# Altium footprint library Connektor.PcbLib: 305 footprints (part 17 of 20)
Each footprint in its own frame and in the unit in brackets; x right, y up, seen from the top. Pads: shape width x height; smd on the part's side, far side on the other; paste and mask are expansions set on the pad; w line width, h text height; cw(c..) or ccw(c..) is an arc to the next point about the centre after c.
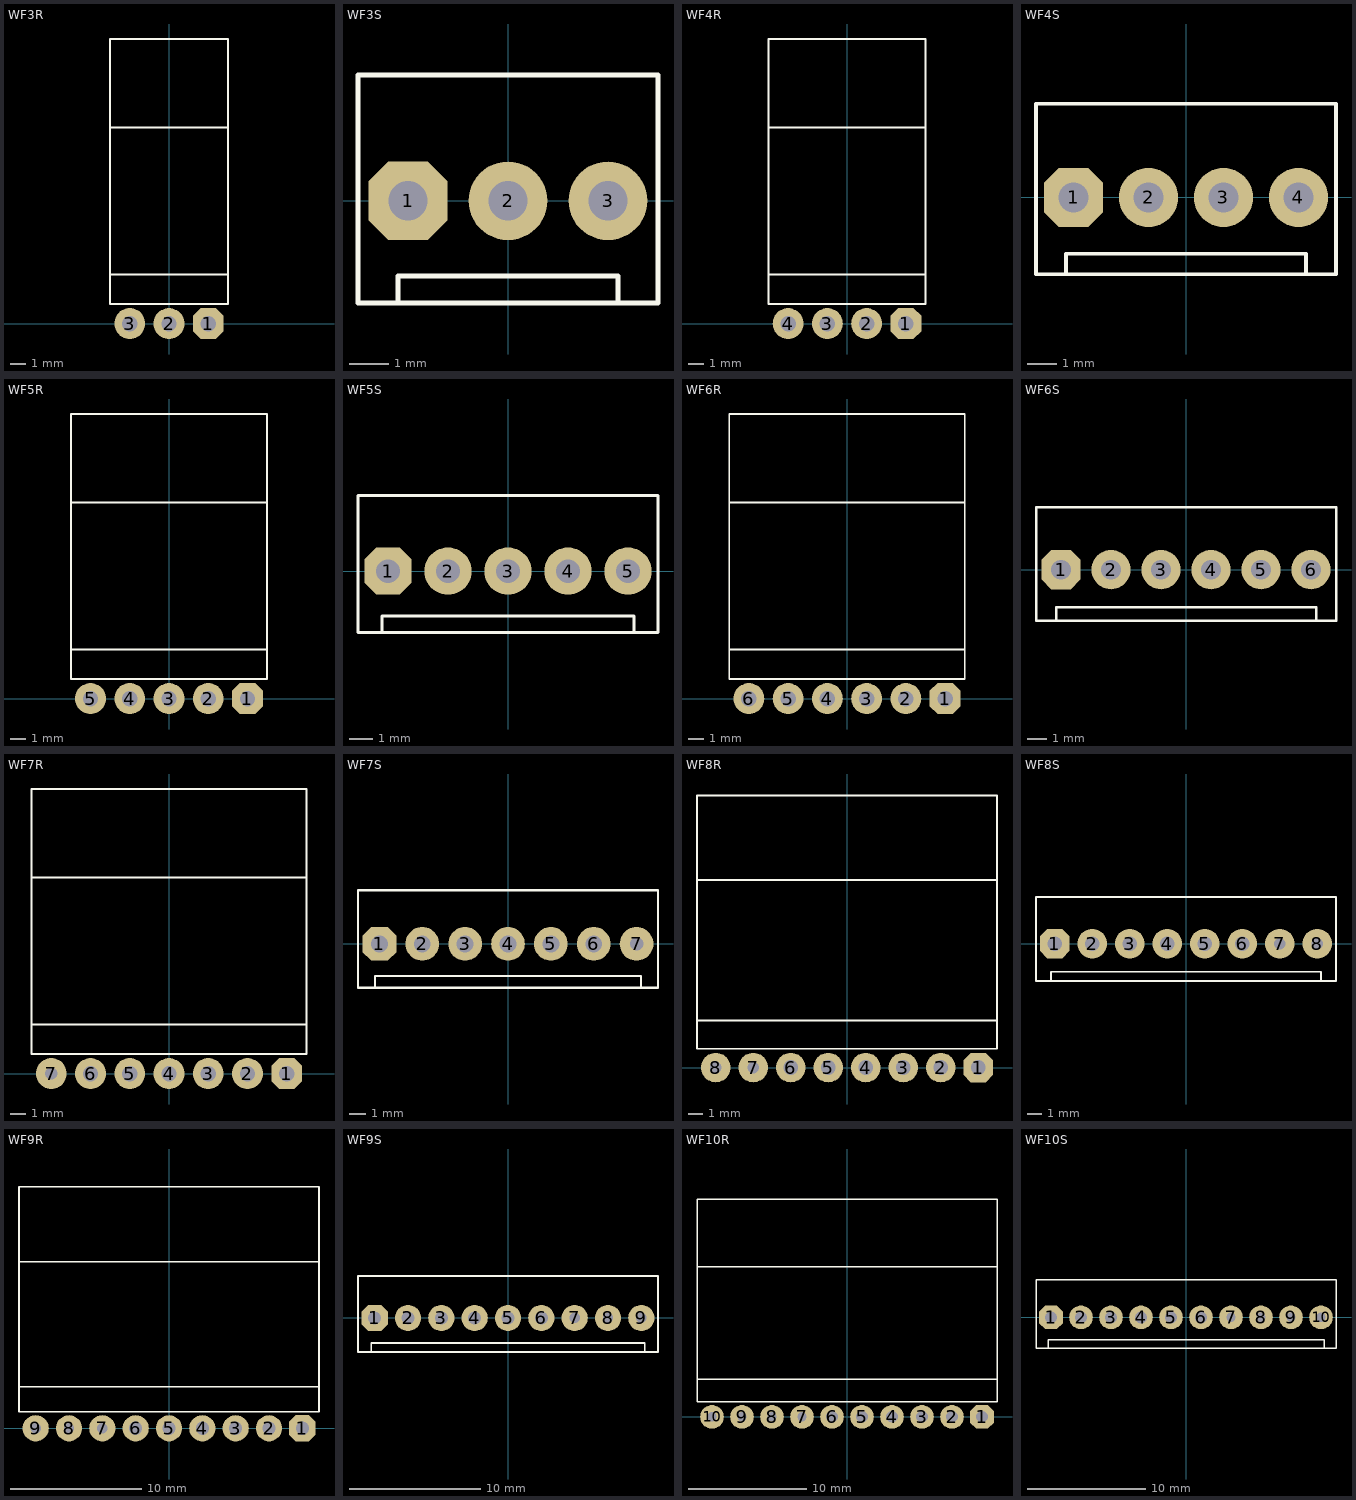
[diagram p16: the footprints below, top view; thin cyan lines are the x and y axes]

## WF3R [mm]
pads (3):
  oct 2x2 hole 1: 1(2.54,0)
  round 2 hole 1: 2(0,0) 3(-2.54,0)
TopOverlay:
  lines w0.127: -3.81,3.175 3.81,3.175 ; -3.81,12.7 3.81,12.7 ; -3.81,1.27 2.54,1.27 3.81,1.27 3.81,18.415 -3.81,18.415 -3.81,1.27
3D body: height 5.8, standoff -2.54, extent -3.81,-0.325 3.81,13.5

## WF3S [mm]
pads (3):
  oct 2x2 hole 1: 1(-2.54,0)
  round 2 hole 1: 2(0,0) 3(2.54,0)
TopOverlay:
  lines w0.127: -2.794,-2.6 -2.794,-1.905 2.794,-1.905 2.794,-2.6 ; -3.81,-2.6 -3.81,3.2 3.81,3.2 3.81,-2.6 -3.81,-2.6
3D body: height 11.5, standoff -3, extent -3.81,-2.6 3.81,3.2

## WF4R [mm]
pads (4):
  oct 2x2 hole 1: 1(3.81,0)
  round 2 hole 1: 2(1.27,0) 3(-1.27,0) 4(-3.81,0)
TopOverlay:
  lines w0.127: -5.08,3.175 5.08,3.175 ; -5.08,12.7 5.08,12.7 ; -5.08,1.27 -5.08,18.415 5.08,18.415 5.08,1.27 1.27,1.27 -5.08,1.27
3D body: height 5.8, standoff -2.54, extent -5.08,-0.325 5.08,13.5

## WF4S [mm]
pads (4):
  oct 2x2 hole 1: 1(-3.81,0)
  round 2 hole 1: 2(-1.27,0) 3(1.27,0) 4(3.81,0)
TopOverlay:
  lines w0.127: -4.064,-2.6 -4.064,-1.905 4.064,-1.905 4.064,-2.6 ; -5.08,-2.6 5.08,-2.6 5.08,3.175 -5.08,3.175 -5.08,-2.6
3D body: height 11.5, standoff -3, extent -5.08,-2.6 5.08,3.2

## WF5R [mm]
pads (5):
  oct 2x2 hole 1: 1(5.08,0)
  round 2 hole 1: 2(2.54,0) 3(0,0) 4(-2.54,0) 5(-5.08,0)
TopOverlay:
  lines w0.127: -6.35,3.175 6.35,3.175 ; -6.35,12.7 6.35,12.7 ; -6.35,1.27 0,1.27 6.35,1.27 6.35,17.78 6.35,18.415 -6.35,18.415 -6.35,1.27
3D body: height 5.8, standoff -2.54, extent -6.35,-0.325 6.35,13.5

## WF5S [mm]
pads (5):
  oct 2x2 hole 1: 1(-5.08,0)
  round 2 hole 1: 2(-2.54,0) 3(0,0) 4(2.54,0) 5(5.08,0)
TopOverlay:
  lines w0.127: -5.334,-2.6 -5.334,-1.905 5.334,-1.905 5.334,-2.6 ; -6.35,-2.6 6.35,-2.6 6.35,3.2 -6.35,3.2 -6.35,-2.6
3D body: height 11.5, standoff -3, extent -6.35,-2.6 6.35,3.2

## WF6R [mm]
pads (6):
  oct 2x2 hole 1: 1(6.35,0)
  round 2 hole 1: 2(3.81,0) 3(1.27,0) 4(-1.27,0) 5(-3.81,0) 6(-6.35,0)
TopOverlay:
  lines w0.127: -7.62,3.175 7.62,3.175 ; -7.62,12.7 7.62,12.7 ; -7.62,1.27 -1.27,1.27 7.62,1.27 7.62,18.415 5.08,18.415 -7.62,18.415 -7.62,1.27
3D body: height 5.8, standoff -2.54, extent -7.62,-0.325 7.62,13.5

## WF6S [mm]
pads (6):
  oct 2x2 hole 1: 1(-6.35,0)
  round 2 hole 1: 2(-3.81,0) 3(-1.27,0) 4(1.27,0) 5(3.81,0) 6(6.35,0)
TopOverlay:
  lines w0.127: -6.604,-2.6 -6.604,-1.905 6.604,-1.905 6.604,-2.6 ; -7.62,-2.6 7.62,-2.6 7.62,3.175 -7.62,3.175 -7.62,-2.6
3D body: height 11.5, standoff -3, extent -7.62,-2.6 7.62,3.2

## WF7R [mm]
pads (7):
  oct 2x2 hole 1: 1(7.62,0)
  round 2 hole 1: 2(5.08,0) 3(2.54,0) 4(0,0) 5(-2.54,0) 6(-5.08,0)
  round 2 hole 0.8: 7(-7.62,0)
TopOverlay:
  lines w0.127: -8.89,3.175 8.89,3.175 ; -8.89,12.7 8.89,12.7 ; -8.89,1.27 0,1.27 8.89,1.27 8.89,18.415 6.35,18.415 -8.89,18.415 -8.89,1.27

## WF7S [mm]
pads (7):
  oct 2x2 hole 1: 1(-7.62,0)
  round 2 hole 1: 2(-5.08,0) 3(-2.54,0) 4(0,0) 5(2.54,0) 6(5.08,0)
  round 2 hole 0.8: 7(7.62,0)
TopOverlay:
  lines w0.127: -7.874,-2.6 -7.874,-1.905 7.874,-1.905 7.874,-2.6 ; -8.89,-2.6 -8.89,3.175 8.89,3.175 8.89,-2.6 -8.89,-2.6
3D body: height 11.5, standoff -3, extent -8.89,-2.6 8.89,3.2

## WF8R [mm]
pads (8):
  oct 2x2 hole 1: 1(8.89,0)
  round 2 hole 1: 2(6.35,0) 3(3.81,0) 4(1.27,0) 5(-1.27,0) 6(-3.81,0)
  round 2 hole 0.8: 7(-6.35,0) 8(-8.89,0)
TopOverlay:
  lines w0.127: -10.16,3.175 10.16,3.175 ; -10.16,12.7 10.16,12.7 ; -10.16,1.27 -10.16,18.415 7.62,18.415 10.16,18.415 10.16,1.27 1.27,1.27 -10.16,1.27

## WF8S [mm]
pads (8):
  oct 2x2 hole 1: 1(-8.89,0)
  round 2 hole 1: 2(-6.35,0) 3(-3.81,0) 4(-1.27,0) 5(1.27,0) 6(3.81,0)
  round 2 hole 0.8: 7(6.35,0) 8(8.89,0)
TopOverlay:
  lines w0.127: -9.144,-2.54 -9.144,-1.905 9.144,-1.905 9.144,-2.54 ; -10.16,-2.54 10.16,-2.54 10.16,3.175 -10.16,3.175 -10.16,-2.54
3D body: height 11.5, standoff -3, extent -10.16,-2.6 10.16,3.2

## WF9R [mm]
pads (9):
  oct 2x2 hole 1: 1(10.16,0)
  round 2 hole 1: 2(7.62,0) 3(5.08,0) 4(2.54,0) 5(0,0) 6(-2.54,0)
  round 2 hole 0.8: 7(-5.08,0) 8(-7.62,0) 9(-10.16,0)
TopOverlay:
  lines w0.127: -11.43,3.175 11.43,3.175 ; -11.43,12.7 11.43,12.7 ; -11.43,1.27 -11.43,18.415 8.89,18.415 11.43,18.415 11.43,1.27 2.54,1.27 -11.43,1.27

## WF9S [mm]
pads (9):
  oct 2x2 hole 1: 1(-10.16,0)
  round 2 hole 1: 2(-7.62,0) 3(-5.08,0) 4(-2.54,0) 5(0,0) 6(2.54,0)
  round 2 hole 0.8: 7(5.08,0) 8(7.62,0) 9(10.16,0)
TopOverlay:
  lines w0.127: -10.414,-2.6 -10.414,-1.905 10.414,-1.905 10.414,-2.6 ; -11.43,-2.6 -11.43,3.2 11.43,3.2 11.43,-2.6 -11.43,-2.6
3D body: height 11.5, standoff -3, extent -11.43,-2.6 11.43,3.2

## WF10R [mm]
pads (10):
  oct 2x2 hole 1: 1(11.43,0)
  round 2 hole 1: 2(8.89,0) 3(6.35,0) 4(3.81,0) 5(1.27,0) 6(-1.27,0)
  round 2 hole 0.8: 7(-3.81,0) 8(-6.35,0) 9(-8.89,0) 10(-11.43,0)
TopOverlay:
  lines w0.127: -12.7,3.175 12.7,3.175 ; -12.7,12.7 12.7,12.7 ; -12.7,1.27 -12.7,18.415 10.16,18.415 12.7,18.415 12.7,1.27 3.81,1.27 -12.7,1.27

## WF10S [mm]
pads (10):
  oct 2x2 hole 1: 1(-11.43,0)
  round 2 hole 1: 2(-8.89,0) 3(-6.35,0) 4(-3.81,0) 5(-1.27,0) 6(1.27,0)
  round 2 hole 0.8: 7(3.81,0) 8(6.35,0) 9(8.89,0) 10(11.43,0)
TopOverlay:
  lines w0.127: -11.684,-2.6 -11.684,-1.905 11.684,-1.905 11.684,-2.6 ; -12.7,-2.6 -12.7,3.175 12.7,3.175 12.7,-2.6 -12.7,-2.6
3D body: height 11.5, standoff -3, extent -12.7,-2.6 12.7,3.2